# Altium footprint library Connectors.PcbLib: 63 footprints (part 1 of 4)
Each footprint in its own frame and in the unit in brackets; x right, y up, seen from the top. Pads: shape width x height; smd on the part's side, far side on the other; paste and mask are expansions set on the pad; w line width, h text height; cw(c..) or ccw(c..) is an arc to the next point about the centre after c.
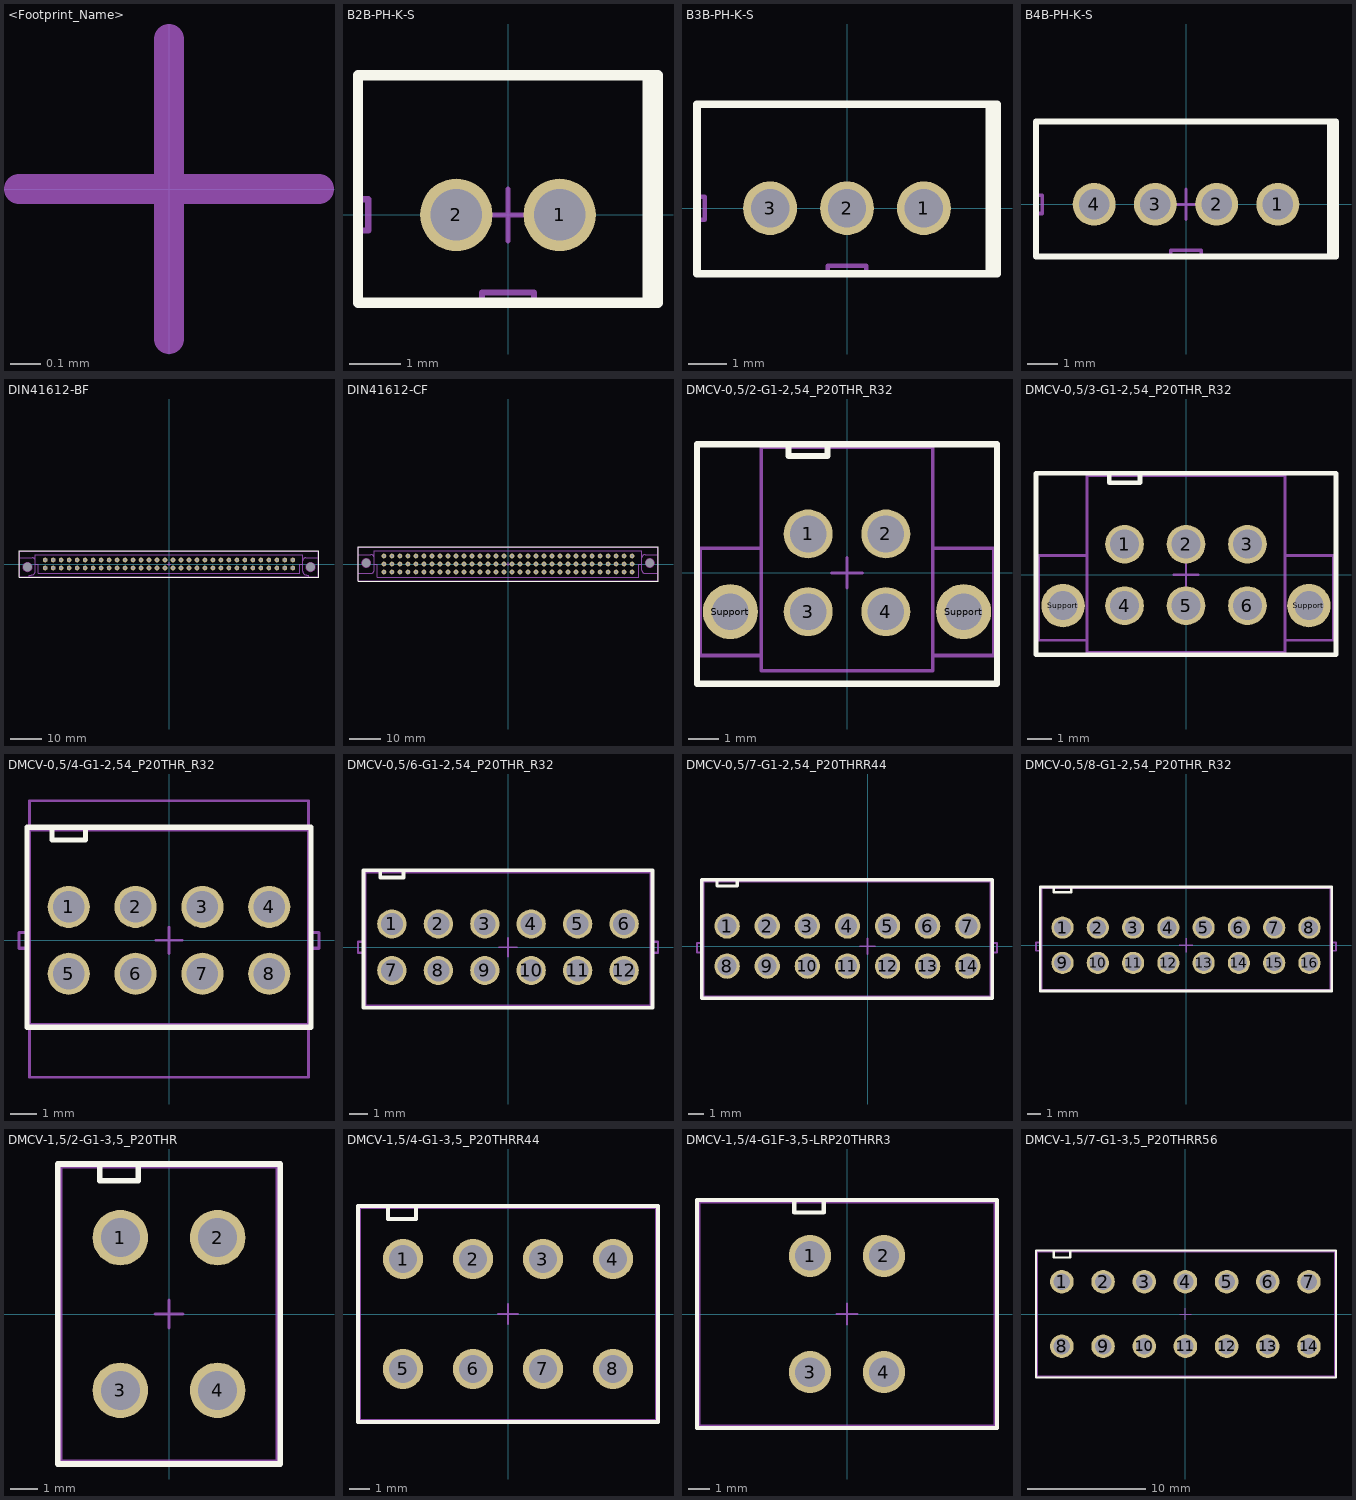
[diagram p0: the footprints below, top view; thin cyan lines are the x and y axes]

## <Footprint_Name> [mm] "<Package_Name>, <Number_of_pins>, <Pitch_in_mm>"
height 2.5
ReperDotTop:
  lines w0.1: -0.5,0 0.5,0 ; 0,-0.5 0,0.5
AssemblyOutlineTop:
  text "'.Designator'" at 0,0 h2.5

## B2B-PH-K-S [mm] "B2B-PH Package, Manufacturer JST, 2 pins, 2 mm"
height 2.5
pads (2):
  round 1.4 hole 1 unplated mask+0.1: 1(1,0) 2(-1,0)
Top Overlay:
  lines w0.2: 2.7,-1.7 2.7,2.7 ; -2.9,-1.7 -2.9,2.7 2.9,2.7 2.9,-1.7 -2.9,-1.7
ReperDotTop:
  lines w0.1: -0.5,0 0.5,0 ; 0,-0.5 0,0.5
AssemblyOutlineTop:
  lines w0.12: -2.9,-0.3 -2.7,-0.3 -2.7,0.3 -2.9,0.3 ; -0.5,-1.7 -0.5,-1.5 0.5,-1.5 0.5,-1.7 ; 2.9,-0.3 2.7,-0.3 2.7,0.3 2.9,0.3 ; -2.9,-1.7 -2.9,2.7 2.9,2.7 2.9,-1.7 -2.9,-1.7
  text "'.Designator'" at 0,0 h2.5
3D body "User Library-b2b-ph-ks-1.step": height 6.05, standoff -2.95, extent -2.95,-1.75 2.95,2.75

## B3B-PH-K-S [mm] "B3B-PH Package, Manufacturer JST, 3 pins, 2 mm"
height 2.5
pads (3):
  round 1.4 hole 1 unplated mask+0.1: 1(2,0) 2(0,0) 3(-2,0)
Top Overlay:
  lines w0.2: 3.7,-1.7 3.7,2.7 ; -3.9,-1.7 3.9,-1.7 3.9,2.7 -3.9,2.7 -3.9,-1.7
ReperDotTop:
  lines w0.1: -0.5,0 0.5,0 ; 0,-0.5 0,0.5
AssemblyOutlineTop:
  lines w0.12: -3.9,-0.3 -3.7,-0.3 -3.7,0.3 -3.9,0.3 ; -0.5,-1.7 -0.5,-1.5 0.5,-1.5 0.5,-1.7 ; 3.9,-0.3 3.7,-0.3 3.7,0.3 3.9,0.3 ; -3.9,-1.7 3.9,-1.7 3.9,2.7 -3.9,2.7 -3.9,-1.7
  text "'.Designator'" at 0,0 h2.5
3D body "User Library-B3B-PH-K-S(LF)(SN).step": height 6, standoff -3.4, extent -3.95,-1.75 3.95,2.75

## B4B-PH-K-S [mm] "B4B-PH Package, Manufacturer JST, 4 pins, 2 mm"
height 2.5
pads (4):
  round 1.4 hole 1 unplated mask+0.1: 1(3,0) 2(1,0) 3(-1,0) 4(-3,0)
Top Overlay:
  lines w0.2: 4.7,-1.7 4.7,2.7 ; -4.9,-1.7 4.9,-1.7 4.9,2.7 -4.9,2.7 -4.9,-1.7
ReperDotTop:
  lines w0.1: -0.5,0 0.5,0 ; 0,-0.5 0,0.5
AssemblyOutlineTop:
  lines w0.12: -4.9,-0.3 -4.7,-0.3 -4.7,0.3 -4.9,0.3 ; -0.5,-1.7 -0.5,-1.5 0.5,-1.5 0.5,-1.7 ; 4.9,-0.3 4.7,-0.3 4.7,0.3 4.9,0.3 ; -4.9,-1.7 4.9,-1.7 4.9,2.7 -4.9,2.7 -4.9,-1.7
  text "'.Designator'" at 0,0 h2.5
3D body "User Library-b4b-ph-k-s.step": height 6, standoff -3, extent -4.95,-1.75 4.95,2.75

## DIN41612-BF [mm] "DIN-41612 Type B Female, 64 pins, Pitch 2.54mm(0.1inch)"
height 2.5
pads (68):
  round 1.5 hole 1 unplated mask+0.1: 1(39.37,1.27) 2(36.83,1.27) 3(34.29,1.27) 4(31.75,1.27) 5(29.21,1.27) 6(26.67,1.27) 7(24.13,1.27) 8(21.59,1.27) 9(19.05,1.27) 10(16.51,1.27) 11(13.97,1.27) 12(11.43,1.27) 13(8.89,1.27) 14(6.35,1.27) 15(3.81,1.27) 16(1.27,1.27) 17(-1.27,1.27) 18(-3.81,1.27) 19(-6.35,1.27) 20(-8.89,1.27) 21(-11.43,1.27) 22(-13.97,1.27) 23(-16.51,1.27) 24(-19.05,1.27) 25(-21.59,1.27) 26(-24.13,1.27) 27(-26.67,1.27) 28(-29.21,1.27) 29(-31.75,1.27) 30(-34.29,1.27) 31(-36.83,1.27) 32(-39.37,1.27) 33(39.37,-1.27) 34(36.83,-1.27) 35(34.29,-1.27) 36(31.75,-1.27) 37(29.21,-1.27) 38(26.67,-1.27) 39(24.13,-1.27) 40(21.59,-1.27) 41(19.05,-1.27) 42(16.51,-1.27) 43(13.97,-1.27) 44(11.43,-1.27) 45(8.89,-1.27) 46(6.35,-1.27) 47(3.81,-1.27) 48(1.27,-1.27) 49(-1.27,-1.27) 50(-3.81,-1.27) 51(-6.35,-1.27) 52(-8.89,-1.27) 53(-11.43,-1.27) 54(-13.97,-1.27) 55(-16.51,-1.27) 56(-19.05,-1.27) 57(-21.59,-1.27) 58(-24.13,-1.27) 59(-26.67,-1.27) 60(-29.21,-1.27) 61(-31.75,-1.27) 62(-34.29,-1.27) 63(-36.83,-1.27) 64(-39.37,-1.27)
  round 0 hole 2.8 unplated mask+0.1: HOLE(-45,-0.975) HOLE(45,-0.975)
  round 3.3 on Keep-Out mask+0.1: Keep-Out(-45,-0.975) Keep-Out(45,-0.975)
Top Overlay:
  lines w0.2: -47.7,-4.2 -47.7,4.2 47.7,4.2 47.7,-4.2 -47.7,-4.2
ReperDotTop:
  lines w0.1: -0.5,0 0.5,0 ; 0,-0.5 0,0.5
AssemblyOutlineTop:
  lines w0.12: -47.5,2 -45,2 -43.5,2 cw(c-43.5,1) -42.5,1 -42.5,-2 -42.5,-2.23 cw(c-43.77,-2.23) -43.77,-3.5 -44.5,-3.5 -44.5,-4 ; 44.5,-4 44.5,-3.5 43.77,-3.5 cw(c43.77,-2.23) 42.5,-2.23 42.5,-2 42.5,1 cw(c43.5,1) 43.5,2 45,2 47.5,2 ; -47.5,-4 -47.5,4 47.5,4 47.5,-4 -47.5,-4 ; -42.5,0 -42.5,3 42.5,3 42.5,0 41.5,0 41.5,-3 -41.5,-3 -41.5,0 -42.5,0
  text "'.Designator'" at 0,0 h2.5
3D body "din_41612_female_b-64abt.stp": height 11.8, standoff -3.8, extent -47.5,-4.05 47.5,4.05

## DIN41612-CF [mm] "DIN-41612 Type C Female, 96 pins, Pitch 2.54mm(0.1inch)"
height 2.5
pads (100):
  round 1.5 hole 1 unplated mask+0.1: 1(39.37,2.54) 2(36.83,2.54) 3(34.29,2.54) 4(31.75,2.54) 5(29.21,2.54) 6(26.67,2.54) 7(24.13,2.54) 8(21.59,2.54) 9(19.05,2.54) 10(16.51,2.54) 11(13.97,2.54) 12(11.43,2.54) 13(8.89,2.54) 14(6.35,2.54) 15(3.81,2.54) 16(1.27,2.54) 17(-1.27,2.54) 18(-3.81,2.54) 19(-6.35,2.54) 20(-8.89,2.54) 21(-11.43,2.54) 22(-13.97,2.54) 23(-16.51,2.54) 24(-19.05,2.54) 25(-21.59,2.54) 26(-24.13,2.54) 27(-26.67,2.54) 28(-29.21,2.54) 29(-31.75,2.54) 30(-34.29,2.54) 31(-36.83,2.54) 32(-39.37,2.54) 33(39.37,0) 34(36.83,0) 35(34.29,0) 36(31.75,0) 37(29.21,0) 38(26.67,0) 39(24.13,0) 40(21.59,0) 41(19.05,0) 42(16.51,0) 43(13.97,0) 44(11.43,0) 45(8.89,0) 46(6.35,0) 47(3.81,0) 48(1.27,0) 49(-1.27,0) 50(-3.81,0) 51(-6.35,0) 52(-8.89,0) 53(-11.43,0) 54(-13.97,0) 55(-16.51,0) 56(-19.05,0) 57(-21.59,0) 58(-24.13,0) 59(-26.67,0) 60(-29.21,0) 61(-31.75,0) 62(-34.29,0) 63(-36.83,0) 64(-39.37,0) 65(39.37,-2.54) 66(36.83,-2.54) 67(34.29,-2.54) 68(31.75,-2.54) 69(29.21,-2.54) 70(26.67,-2.54) 71(24.13,-2.54) 72(21.59,-2.54) 73(19.05,-2.54) 74(16.51,-2.54) 75(13.97,-2.54) 76(11.43,-2.54) 77(8.89,-2.54) 78(6.35,-2.54) 79(3.81,-2.54) 80(1.27,-2.54) 81(-1.27,-2.54) 82(-3.81,-2.54) 83(-6.35,-2.54) 84(-8.89,-2.54) 85(-11.43,-2.54) 86(-13.97,-2.54) 87(-16.51,-2.54) 88(-19.05,-2.54) 89(-21.59,-2.54) 90(-24.13,-2.54) 91(-26.67,-2.54) 92(-29.21,-2.54) 93(-31.75,-2.54) 94(-34.29,-2.54) 95(-36.83,-2.54) 96(-39.37,-2.54)
  round 0 hole 2.8 unplated mask+0.1: Hole(-45,0.3) Hole(45,0.3)
  round 3.2 on Keep-Out mask+0.1: Keep-Out(-45,0.3) Keep-Out(45,0.3)
Top Overlay:
  lines w0.2: -47.6,-5.4 -47.6,5.4 47.6,5.4 47.6,-5.4 -47.6,-5.4
ReperDotTop:
  lines w0.1: -0.5,0 0.5,0 ; 0,-0.5 0,0.5
AssemblyOutlineTop:
  lines w0.12: -47.5,-3 -43.5,-3 ; -47.5,3 -43.5,3 ; 47.5,-3 43.5,-3 ; 47.5,3 43.5,3 ; -43.5,-3 ccw(c-43.5,-2) -42.5,-2 -42.5,2 ccw(c-43.5,2) -43.5,3 ; -43.5,-3 -43.5,-3 ; -43.5,3 -43.5,3 ; 43.5,-3 cw(c43.5,-2) 42.5,-2 42.5,2 cw(c43.5,2) 43.5,3 ; 43.5,-3 43.5,-3 ; 43.5,3 43.5,3 ; -47.5,-5.3 -47.5,5.3 47.5,5.3 47.5,-5.3 -47.5,-5.3 ; -42.5,0 -41.5,0 -41.5,-4.2 41.5,-4.2 41.5,0 42.5,0 42.5,4.2 -42.5,4.2 -42.5,0
  text "'.Designator'" at 0,0 h2.5
3D body "din_41612_female_c-96abct.stp": height 11.7, standoff -3.9, extent -47.5,-5.3 47.5,5.3

## DMCV-0,5/2-G1-2,54_P20THR_R32 [mm] "DMCV-0,5/4-G1-2,54, 4 pins, Pitch 2.54mm(0.1inch), Vendor Phoenix Contact, Code ¹1844895"
height 2.5
pads (6):
  round 1.6 hole 1.2 mask+0.1: 1(-1.27,1.27) 2(1.27,1.27) 3(-1.27,-1.27) 4(1.27,-1.27)
  round 1.8 hole 1.2 mask+0.1: Support(-3.81,-1.27) Support(3.81,-1.27)
Top Overlay:
  lines w0.2: -1.905,4.2 -1.905,3.81 -0.635,3.81 -0.635,4.2 ; -4.9,-3.625 4.9,-3.625 4.9,4.2 -4.9,4.2 -4.9,-3.625
ReperDotTop:
  lines w0.1: -0.5,0 0.5,0 ; 0,-0.5 0,0.5
AssemblyOutlineTop:
  lines w0.12: -2.8,-2.7 -4.8,-2.7 -4.8,0.8 -2.8,0.8 ; 2.8,-2.7 4.8,-2.7 4.8,0.8 2.8,0.8 ; -2.8,-3.2 2.8,-3.2 2.8,4.1 -2.8,4.1 -2.8,-3.2
  text "'.Designator'" at 0,0 h2.5
3D body "pxc_1844879_02_DMCV-0-5-2-G1-2-54-P20THR-R32_3D.stp": height 7.1, standoff -2, extent -4.825,-3.245 4.845,4.145

## DMCV-0,5/3-G1-2,54_P20THR_R32 [mm] "DMCV-0,5/3-G1-2,54, 6 pins, Pitch 2.54mm(0.1inch), Vendor Phoenix Contact, Code ¹1844882"
height 2.5
pads (8):
  round 1.6 hole 1.2 mask+0.1: 1(-2.54,1.27) 2(0,1.27) 3(2.54,1.27) 4(-2.54,-1.27) 5(0,-1.27) 6(2.54,-1.27)
  round 1.8 hole 1.2 mask+0.1: Support(-5.08,-1.27) Support(5.08,-1.27)
Top Overlay:
  lines w0.2: -3.175,4.2 -3.175,3.81 -1.905,3.81 -1.905,4.2 ; -6.2,-3.3 -6.2,4.2 6.2,4.2 6.2,-3.3 -6.2,-3.3
ReperDotTop:
  lines w0.1: -0.5,0 0.5,0 ; 0,-0.5 0,0.5
AssemblyOutlineTop:
  lines w0.12: -4.1,-2.7 -6.1,-2.7 -6.1,0.8 -4.1,0.8 ; 4.1,-2.7 6.1,-2.7 6.1,0.8 4.1,0.8 ; -4.1,-3.2 -4.1,4.1 4.1,4.1 4.1,-3.2 -4.1,-3.2
  text "'.Designator'" at 0,0 h2.5
3D body "pxc_1844882_02_DMCV-0-5-3-G1-2-54-P20THR-R24_3D.stp": height 7.1, standoff -2, extent -6.105,-3.25 6.105,4.14

## DMCV-0,5/4-G1-2,54_P20THR_R32 [mm] "DMCV-0,5/4-G1-2,54, 8 pins, Pitch 2.54mm(0.1inch), Vendor Phoenix Contact, Code ¹1844895"
height 2.5
pads (8):
  round 1.6 hole 1.2 mask+0.1: 1(-3.81,1.27) 2(-1.27,1.27) 3(1.27,1.27) 4(3.81,1.27) 5(-3.81,-1.27) 6(-1.27,-1.27) 7(1.27,-1.27) 8(3.81,-1.27)
Top Overlay:
  lines w0.2: -4.445,4.3 -4.445,3.81 -3.175,3.81 -3.175,4.3 ; -5.4,-3.3 -5.4,4.3 5.4,4.3 5.4,-3.3 -5.4,-3.3
ReperDotTop:
  lines w0.1: -0.5,0 0.5,0 ; 0,-0.5 0,0.5
AssemblyOutlineTop:
  lines w0.1: -5.3,-3.2 -5.3,-5.2 5.3,-5.2 5.3,-3.2 ; -5.3,4.2 -5.3,5.3 5.3,5.3 5.3,4.2
  lines w0.12: -5.3,-0.3 -5.7,-0.3 -5.7,0.3 -5.3,0.3 ; 5.3,-0.3 5.7,-0.3 5.7,0.3 5.3,0.3 ; -5.3,-3.2 5.3,-3.2 5.3,4.2 -5.3,4.2 -5.3,-3.2
  text "'.Designator'" at 0,0 h2.5
3D body "pxc_1844895_01_DMCV-0-5-4-G1-2-54-P20THR-R32_3D.stp": height 7.1, standoff -2, extent -5.73,-3.225 5.73,4.165

## DMCV-0,5/6-G1-2,54_P20THR_R32 [mm] "DMCV-0,5/6-G1-2,54, 12 pins, Pitch 2.54mm(0.1inch), Vendor Phoenix Contact, Code ¹1844918"
height 2.5
pads (12):
  round 1.6 hole 1.2 mask+0.1: 1(-6.35,1.27) 2(-3.81,1.27) 3(-1.27,1.27) 4(1.27,1.27) 5(3.81,1.27) 6(6.35,1.27) 7(-6.35,-1.27) 8(-3.81,-1.27) 9(-1.27,-1.27) 10(1.27,-1.27) 11(3.81,-1.27) 12(6.35,-1.27)
Top Overlay:
  lines w0.2: -6.985,4.2 -6.985,3.81 -5.715,3.81 -5.715,4.2 ; -7.9,-3.3 -7.9,4.2 7.9,4.2 7.9,-3.3 -7.9,-3.3
ReperDotTop:
  lines w0.1: -0.5,0 0.5,0 ; 0,-0.5 0,0.5
AssemblyOutlineTop:
  lines w0.12: -7.8,-0.3 -8.2,-0.3 -8.2,0.3 -7.8,0.3 ; 7.8,-0.3 8.2,-0.3 8.2,0.3 7.8,0.3 ; -7.8,-3.2 7.8,-3.2 7.8,4.1 -7.8,4.1 -7.8,-3.2
  text "'.Designator'" at 0,0 h2.5
3D body "pxc_1844918_01_DMCV-0-5-6-G1-2-54-P20THR-R44_3D.stp": height 7.1, standoff -2, extent -8.27,-3.225 8.27,4.165

## DMCV-0,5/7-G1-2,54_P20THRR44 [mm] "DMCV 0,5/ 7-G1-2,54, 14 pins, Pitch 2.54mm(0.1inch), Vendor Phoenix Contact, Code ¹1844921"
height 2.5
pads (14):
  round 1.6 hole 1.2 mask+0.1: 1(-8.89,1.27) 2(-6.35,1.27) 3(-3.81,1.27) 4(-1.27,1.27) 5(1.27,1.27) 6(3.81,1.27) 7(6.35,1.27) 8(-8.89,-1.27) 9(-6.35,-1.27) 10(-3.81,-1.27) 11(-1.27,-1.27) 12(1.27,-1.27) 13(3.81,-1.27) 14(6.35,-1.27)
Top Overlay:
  lines w0.2: -9.525,4.2 -9.525,3.81 -8.255,3.81 -8.255,4.2 ; -10.5,-3.3 -10.5,4.2 7.9,4.2 7.9,-3.3 -10.5,-3.3
ReperDotTop:
  lines w0.1: -0.5,0 0.5,0 ; 0,-0.5 0,0.5
AssemblyOutlineTop:
  lines w0.12: -10.4,-0.4 -10.8,-0.4 -10.8,0.2 -10.4,0.2 ; 7.8,-0.4 8.2,-0.4 8.2,0.2 7.8,0.2 ; -10.4,-3.2 7.8,-3.2 7.8,4.1 -10.4,4.1 -10.4,-3.2
  text "'.Designator'" at 0,0 h2.5
3D body "pxc_1844921_01_DMCV-0-5-7-G1-2-54-P20THR-R44_3D.stp": height 7.1, standoff -2, extent -10.81,-3.25 8.27,4.14

## DMCV-0,5/8-G1-2,54_P20THR_R32 [mm] "DMCV-0,5/6-G1-2,54, 12 pins, Pitch 2.54mm(0.1inch), Vendor Phoenix Contact, Code ¹1844918"
height 2.5
pads (16):
  round 1.6 hole 1.2 mask+0.1: 1(-8.89,1.27) 2(-6.35,1.27) 3(-3.81,1.27) 4(-1.27,1.27) 5(1.27,1.27) 6(3.81,1.27) 7(6.35,1.27) 8(8.89,1.27) 9(-8.89,-1.27) 10(-6.35,-1.27) 11(-3.81,-1.27) 12(-1.27,-1.27) 13(1.27,-1.27) 14(3.81,-1.27) 15(6.35,-1.27) 16(8.89,-1.27)
Top Overlay:
  lines w0.2: -9.525,4.2 -9.525,3.81 -8.255,3.81 -8.255,4.2 ; -10.5,-3.3 -10.5,4.2 10.5,4.2 10.5,-3.3 -10.5,-3.3
ReperDotTop:
  lines w0.1: -0.5,0 0.5,0 ; 0,-0.5 0,0.5
AssemblyOutlineTop:
  lines w0.12: -10.4,-0.4 -10.8,-0.4 -10.8,0.2 -10.4,0.2 ; 10.4,-0.4 10.8,-0.4 10.8,0.2 10.4,0.2 ; -10.4,-3.2 10.4,-3.2 10.4,4.1 -10.4,4.1 -10.4,-3.2
  text "'.Designator'" at 0,0 h2.5
3D body "pxc_1844934_01_DMCV-0-5-8-G1-2-54-P20THR-R44_3D.stp": height 7.1, standoff -2, extent -10.81,-3.25 10.81,4.14

## DMCV-1,5/2-G1-3,5_P20THR [mm] "DMCV 1.5/ 2-G1 3.5, 4 pins, Pitch 3.5mm, Vendor Phoenix Contact, Code ¹1787205"
height 2.5
pads (4):
  round 2 hole 1.4 unplated mask+0.1: 1(-1.75,2.75) 2(1.75,2.75) 3(-1.75,-2.75) 4(1.75,-2.75)
Top Overlay:
  lines w0.2: -2.5,5.4 -2.5,4.8 -1.1,4.8 -1.1,5.4 ; -4,-5.4 4,-5.4 4,5.4 -4,5.4 -4,-5.4
ReperDotTop:
  lines w0.1: -0.5,0 0.5,0 ; 0,-0.5 0,0.5
AssemblyOutlineTop:
  lines w0.12: -3.9,-5.3 -3.9,5.3 3.9,5.3 3.9,-5.3 -3.9,-5.3
  text "'.Designator'" at 0,0 h2.5
3D body "pxc_1787205_00_DMCV-1-5-2-G1-3-5-P20THR_3D.stp": height 10.05, standoff -1.95, extent -3.9,-5.3 3.9,5.3

## DMCV-1,5/4-G1-3,5_P20THRR44 [mm] "DMCV 1,5/ 4-G1-3,5, 8 pins, Pitch 3.5mm, Vendor Phoenix Contact, Code ¹1818591"
height 2.5
pads (8):
  round 2 hole 1.4 unplated mask+0.1: 1(-5.25,2.75) 2(-1.75,2.75) 3(1.75,2.75) 4(5.25,2.75) 5(-5.25,-2.75) 6(-1.75,-2.75) 7(1.75,-2.75) 8(5.25,-2.75)
Top Overlay:
  lines w0.2: -6,5.35 -6,4.75 -4.6,4.75 -4.6,5.35 ; -7.5,-5.4 7.5,-5.4 7.5,5.4 -7.5,5.4 -7.5,-5.4
ReperDotTop:
  lines w0.1: -0.5,0 0.5,0 ; 0,-0.5 0,0.5
AssemblyOutlineTop:
  lines w0.12: -7.4,-5.3 -7.4,5.3 7.4,5.3 7.4,-5.3 -7.4,-5.3
  text "'.Designator'" at 0,0 h2.5
3D body "pxc_1818591_01_DMCV-1-5-4-G1-3-5-P20THR-R44_3D.stp": height 10, standoff -2, extent -7.4,-5.3 7.4,5.3

## DMCV-1,5/4-G1F-3,5-LRP20THRR3 [mm] "DMCV 1.5/ 2-G1F-3.5, 4 pins, Pitch 3.5mm, Vendor Phoenix Contact, Code ¹1818708"
height 2.5
pads (4):
  round 2 hole 1.4 unplated mask+0.1: 1(-1.75,2.75) 2(1.75,2.75) 3(-1.75,-2.75) 4(1.75,-2.75)
Top Overlay:
  lines w0.2: -2.5,5.4 -2.5,4.8 -1.1,4.8 -1.1,5.4 ; -7.1,-5.4 7.1,-5.4 7.1,5.4 -7.1,5.4 -7.1,-5.4
ReperDotTop:
  lines w0.1: -0.5,0 0.5,0 ; 0,-0.5 0,0.5
AssemblyOutlineTop:
  lines w0.12: -7,-5.3 -7,5.3 7,5.3 7,-5.3 -7,-5.3
  text "'.Designator'" at 0,0 h2.5
3D body "pxc_1818708_01_DMCV-1-5-2-G1F-3-5-LRP20THRR32_3D.stp": height 10, standoff -2, extent -7,-5.3 7,5.3

## DMCV-1,5/7-G1-3,5_P20THRR56 [mm] "DMCV 1.5/ 7 G1 3.5, 14 pins, Pitch 3.5mm, Vendor Phoenix Contact, Code ¹1818627"
height 2.5
pads (14):
  round 2 hole 1.4 unplated mask+0.1: 1(-10.5,2.75) 2(-7,2.75) 3(-3.5,2.75) 4(0,2.75) 5(3.5,2.75) 6(7,2.75) 7(10.5,2.75) 8(-10.5,-2.75) 9(-7,-2.75) 10(-3.5,-2.75) 11(0,-2.75) 12(3.5,-2.75) 13(7,-2.75) 14(10.5,-2.75)
Top Overlay:
  lines w0.2: -11.2,5.4 -11.2,4.8 -9.8,4.8 -9.8,5.4 ; -12.7,-5.4 -12.7,5.4 12.8,5.4 12.8,-5.4 -12.7,-5.4
ReperDotTop:
  lines w0.1: -0.5,0 0.5,0 ; 0,-0.5 0,0.5
AssemblyOutlineTop:
  lines w0.12: -12.6,-5.3 12.7,-5.3 12.7,5.3 -12.6,5.3 -12.6,-5.3
  text "'.Designator'" at 0,0 h2.5
3D body "pxc_1818627_00_DMCV-1-5-7-G1-3-5-P20THR-R56_3D.stp": height 10.1, standoff -1.9, extent -12.65,-5.3 12.65,5.3